# Altium footprint library Pcb-hionyPcbLib.PcbLib: 580 footprints (part 25 of 37)
Each footprint in its own frame and in the unit in brackets; x right, y up, seen from the top. Pads: shape width x height; smd on the part's side, far side on the other; paste and mask are expansions set on the pad; w line width, h text height; cw(c..) or ccw(c..) is an arc to the next point about the centre after c.
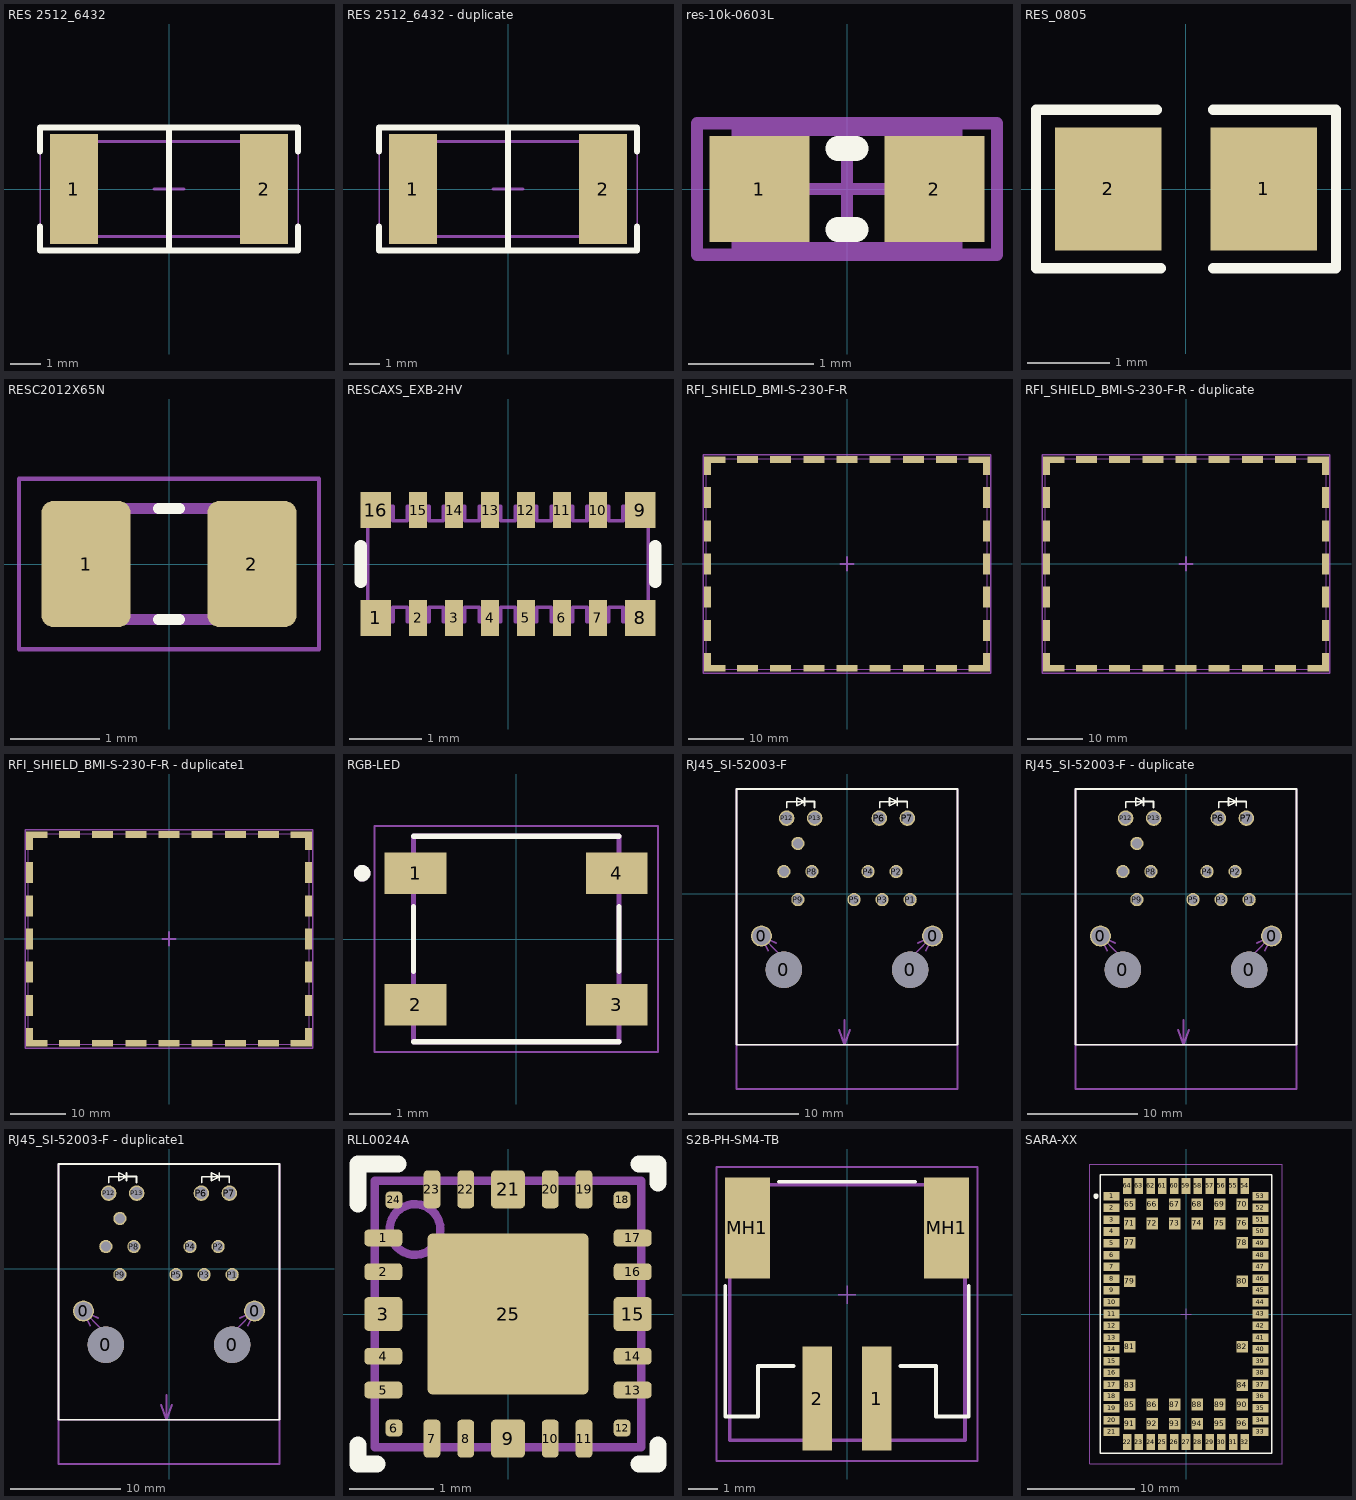
[diagram p24: the footprints below, top view; thin cyan lines are the x and y axes]

## RES 2512_6432 [mm]
pads (2):
  rect 1.6x3.65 smd: 1(-3.175,0) 2(3.175,0)
Top Overlay:
  lines w0.2: -4.3,-1.25 -4.3,-2.05 4.3,-2.05 4.3,-1.25 ; -4.3,1.25 -4.3,2.05 4.3,2.05 4.3,1.25 ; 0,-2.05 0,2.05
Mechanical 13:
  lines w0.1: -3.149,-1.575 3.15,-1.575 3.15,1.225 3.15,1.575 -3.149,1.575 -3.149,-1.575
Mechanical 15:
  lines w0.05: -4.3,-2.1 4.3,-2.1 4.3,2.1 -4.3,2.1 -4.3,-2.1
  lines w0.1: -0.5,0 0.5,0 ; 0,-0.5 0,0.5
3D body "RES - 2512.step": height 0.7, standoff 0, extent -3.15,-1.575 3.15,1.575

## RES 2512_6432 - duplicate [mm]
pads (2):
  rect 1.6x3.65 smd: 1(-3.175,0) 2(3.175,0)
Top Overlay:
  lines w0.2: -4.3,-1.25 -4.3,-2.05 4.3,-2.05 4.3,-1.25 ; -4.3,1.25 -4.3,2.05 4.3,2.05 4.3,1.25 ; 0,-2.05 0,2.05
Mechanical 13:
  lines w0.1: -3.149,-1.575 3.15,-1.575 3.15,1.225 3.15,1.575 -3.149,1.575 -3.149,-1.575
Mechanical 15:
  lines w0.05: -4.3,-2.1 4.3,-2.1 4.3,2.1 -4.3,2.1 -4.3,-2.1
  lines w0.1: -0.5,0 0.5,0 ; 0,-0.5 0,0.5
3D body "RES - 2512.step": height 0.7, standoff 0, extent -3.15,-1.575 3.15,1.575

## res-10k-0603L [mm]
pads (2):
  rect 0.8x0.85 smd: 1(-0.7,0) 2(0.7,0)
Top Overlay:
  lines w0.2: -0.071,-0.325 0.071,-0.325 ; -0.071,0.325 0.071,0.325
Top 3D Body:
  lines w0.1: -1.2,-0.525 1.2,-0.525 1.2,0.525 -1.2,0.525 -1.2,-0.525
  text ".Designator" at -1.05,-0.275 h0.56
Mechanical 13:
  lines w0.1: -0.55,-0.475 -0.55,0.475 ; 0.55,-0.475 0.55,0.475 ; -0.875,-0.475 0.875,-0.475 0.875,0.475 -0.875,0.475 -0.875,-0.475
Mechanical 15:
  lines w0.1: -0.475,0 0.475,0 ; 0,-0.475 0,0.475 ; -1.2,-0.525 -1.2,0.525 1.2,0.525 1.2,-0.525 -1.2,-0.525
3D body: height 1, standoff 0, extent -0.874,-0.474 -0.551,0.474
3D body: height 1, standoff 0, extent -0.549,-0.474 0.549,0.474
3D body: height 1, standoff 0, extent 0.551,-0.474 0.874,0.474

## RES_0805 [mm] "Resister"
height 0.65
pads (2):
  rect 1.3x1.5 smd mask+0.076: 1(0.95,0) 2(-0.95,0)
Top Overlay:
  lines w0.127: -0.356,0.965 -1.829,0.965 -1.829,-0.965 -0.305,-0.965 ; 0.33,-0.965 1.829,-0.965 1.829,0.965 0.33,0.965
3D body "RES0805.stp": height 0.5, standoff 0, extent -1,-0.63 1,0.62

## RESC2012X65N [mm]
pads (2):
  rrect25% 1x1.42 smd: 1(-0.935,0) 2(0.935,0)
Top Overlay:
  lines w0.127: -0.115,-0.625 0.115,-0.625 ; -0.115,0.625 0.115,0.625
Mechanical 13:
  lines w0.127: -1,-0.625 -1,0.625 1,0.625 1,-0.625 -1,-0.625
Mechanical 15:
  lines w0.05: -1.69,-0.96 -1.69,0.96 1.69,0.96 1.69,-0.96 -1.69,-0.96
3D body "step_temp.STEP": height 0.65, standoff 0, extent -1,-0.625 1,0.625

## RESCAXS_EXB-2HV [mm]
pads (16):
  rect 0.425x0.5 smd mask+0.07: 1(-1.837,-0.75) 8(1.837,-0.75) 9(1.837,0.75) 16(-1.837,0.75)
  rect 0.25x0.5 smd mask+0.07: 2(-1.25,-0.75) 3(-0.75,-0.75) 4(-0.25,-0.75) 5(0.25,-0.75) 6(0.75,-0.75) 7(1.25,-0.75) 10(1.25,0.75) 11(0.75,0.75) 12(0.25,0.75) 13(-0.25,0.75) 14(-0.75,0.75) 15(-1.25,0.75)
Top Overlay:
  lines w0.17: -2.05,-0.25 -2.05,0.25 ; 2.05,-0.25 2.05,0.25
Top 3D Body:
  lines w0.05: -1.95,-0.8 -1.95,0.8 -1.6,0.8 -1.6,0.6 -1.4,0.6 -1.4,0.8 -1.1,0.8 -1.1,0.6 -0.9,0.6 -0.9,0.8 -0.6,0.8 -0.6,0.6 -0.4,0.6 -0.4,0.8 -0.1,0.8 -0.1,0.6 0.1,0.6 0.1,0.8 0.4,0.8 0.4,0.6 0.6,0.6 0.6,0.8 0.9,0.8 0.9,0.6 1.1,0.6 1.1,0.8 1.4,0.8 1.4,0.6 1.6,0.6 1.6,0.8 1.95,0.8 1.95,-0.8 1.6,-0.8 1.6,-0.6 1.4,-0.6 1.4,-0.8 1.1,-0.8 1.1,-0.6 0.9,-0.6 0.9,-0.8 0.6,-0.8 0.6,-0.6 0.4,-0.6 0.4,-0.8 0.1,-0.8 0.1,-0.6 -0.1,-0.6 -0.1,-0.8 -0.4,-0.8 -0.4,-0.6 -0.6,-0.6 -0.6,-0.8 -0.9,-0.8 -0.9,-0.6 -1.1,-0.6 -1.1,-0.8 -1.4,-0.8 -1.4,-0.6 -1.6,-0.6 -1.6,-0.8 -1.95,-0.8
  text ".Designator" at -0.9,-0.25 h0.5
3D body: height 0.55, standoff 0, extent -1.949,-0.799 1.949,0.799
3D body: height 0.55, standoff 0.52, extent -1.949,-0.449 1.949,0.449

## RFI_SHIELD_BMI-S-230-F-R [mm]
pads (32):
  rect 1.2x3.35 smd mask+0.05: 1(-25.2,-17.787) 1(-25.2,17.762) 1(25.2,-17.787) 1(25.2,17.762)
  rect 1.2x3.8 smd mask+0.05: 1(-25.2,-12.013) 1(-25.2,-6.013) 1(-25.2,-0.012) 1(-25.2,5.988) 1(-25.2,11.988) 1(25.2,-12.013) 1(25.2,-6.013) 1(25.2,-0.012) 1(25.2,5.988) 1(25.2,11.988)
  rect 3.85x1.2 smd mask+0.05: 1(-23.875,-18.862) 1(-23.875,18.838) 1(23.875,-18.862) 1(23.875,18.838)
  rect 3.8x1.2 smd mask+0.05: 1(-18,-18.837) 1(-18,18.863) 1(-12,-18.837) 1(-12,18.863) 1(-6,-18.837) 1(-6,18.863) 1(0,-18.837) 1(0,18.863) 1(6,-18.837) 1(6,18.863) 1(12,-18.837) 1(12,18.863) 1(18,-18.837) 1(18,18.863)
Mechanical 13:
  lines w0.15: -25.425,-19.062 -25.425,19.037 25.375,19.037 25.375,-19.062 -25.425,-19.062 ; -17.65,-19.062 -17.65,-19.063
Mechanical 15:
  lines w0.3: -1.25,0 1.25,0 ; 0,-1.25 0,1.25 ; -26,-19.75 -26,19.75 26,19.75 26,-19.75 -26,-19.75
  text "RF shield (frame + cover)" at -22.35,-19.2 h0.55
  text ".Designator" at -25.55,-19.2 h0.55
3D body "Masach Technologies-MS511-20.STEP": height 6.6, standoff -0.8, extent -26.15,-19.8 26.15,19.8

## RFI_SHIELD_BMI-S-230-F-R - duplicate [mm]
pads (32):
  rect 1.2x3.35 smd mask+0.05: 1(-25.2,-17.787) 1(-25.2,17.762) 1(25.2,-17.787) 1(25.2,17.762)
  rect 1.2x3.8 smd mask+0.05: 1(-25.2,-12.013) 1(-25.2,-6.013) 1(-25.2,-0.012) 1(-25.2,5.988) 1(-25.2,11.988) 1(25.2,-12.013) 1(25.2,-6.013) 1(25.2,-0.012) 1(25.2,5.988) 1(25.2,11.988)
  rect 3.85x1.2 smd mask+0.05: 1(-23.875,-18.862) 1(-23.875,18.838) 1(23.875,-18.862) 1(23.875,18.838)
  rect 3.8x1.2 smd mask+0.05: 1(-18,-18.837) 1(-18,18.863) 1(-12,-18.837) 1(-12,18.863) 1(-6,-18.837) 1(-6,18.863) 1(0,-18.837) 1(0,18.863) 1(6,-18.837) 1(6,18.863) 1(12,-18.837) 1(12,18.863) 1(18,-18.837) 1(18,18.863)
Mechanical 13:
  lines w0.15: -25.425,-19.062 -25.425,19.037 25.375,19.037 25.375,-19.062 -25.425,-19.062 ; -17.65,-19.062 -17.65,-19.063
Mechanical 15:
  lines w0.3: -1.25,0 1.25,0 ; 0,-1.25 0,1.25 ; -26,-19.75 -26,19.75 26,19.75 26,-19.75 -26,-19.75
  text "RF shield (frame + cover)" at -22.05,-19.225 h0.55
  text ".Designator" at -25.6,-19.325 h0.55
3D body "Masach Technologies-MS511-20.STEP": height 6.6, standoff -0.8, extent -26.15,-19.8 26.15,19.8

## RFI_SHIELD_BMI-S-230-F-R - duplicate1 [mm]
pads (32):
  rect 1.2x3.35 smd mask+0.05: 1(-25.2,-17.787) 1(-25.2,17.762) 1(25.2,-17.787) 1(25.2,17.762)
  rect 1.2x3.8 smd mask+0.05: 1(-25.2,-12.013) 1(-25.2,-6.013) 1(-25.2,-0.012) 1(-25.2,5.988) 1(-25.2,11.988) 1(25.2,-12.013) 1(25.2,-6.013) 1(25.2,-0.012) 1(25.2,5.988) 1(25.2,11.988)
  rect 3.85x1.2 smd mask+0.05: 1(-23.875,-18.862) 1(-23.875,18.838) 1(23.875,-18.862) 1(23.875,18.838)
  rect 3.8x1.2 smd mask+0.05: 1(-18,-18.837) 1(-18,18.863) 1(-12,-18.837) 1(-12,18.863) 1(-6,-18.837) 1(-6,18.863) 1(0,-18.837) 1(0,18.863) 1(6,-18.837) 1(6,18.863) 1(12,-18.837) 1(12,18.863) 1(18,-18.837) 1(18,18.863)
Mechanical 13:
  lines w0.15: -25.425,-19.062 -25.425,19.037 25.375,19.037 25.375,-19.062 -25.425,-19.062 ; -17.65,-19.062 -17.65,-19.063
Mechanical 15:
  lines w0.3: -1.25,0 1.25,0 ; 0,-1.25 0,1.25 ; -26,-19.75 -26,19.75 26,19.75 26,-19.75 -26,-19.75
  text "RF shield (frame + cover)" at -22.05,-19.225 h0.55
  text ".Designator" at -25.6,-19.325 h0.55
3D body "Masach Technologies-MS511-20.STEP": height 6.6, standoff -0.8, extent -26.15,-19.8 26.15,19.8

## RGB-LED [mm]
pads (4):
  rect 1.5x1 smd: 1(-2.45,1.6) 2(-2.45,-1.6) 3(2.45,-1.6) 4(2.45,1.6)
Top Overlay:
  circle w0.2: c-3.75,1.6 r0.1
  lines w0.127: -2.5,-2.5 2.5,-2.5 ; -2.5,-0.787 -2.5,0.787 ; -2.5,2.5 2.5,2.5 ; 2.5,-0.787 2.5,0.787
Mechanical 13:
  circle w0.2: c-3.75,1.6 r0.1
  lines w0.127: -2.5,-2.5 2.5,-2.5 2.5,2.5 -2.5,2.5 -2.5,-2.5
Mechanical 15:
  lines w0.05: -3.45,-2.75 3.45,-2.75 3.45,2.75 -3.45,2.75 -3.45,-2.75
3D body "1655--3DModel-STEP-56544.STEP": height 1.5, standoff -0.1, extent -2.7,-2.5 2.7,2.5

## RJ45_SI-52003-F [mm]
pads (17):
  round 1.9 hole 1.6 mask+0.05: 0(-7.745,-3.81) 0(7.745,-3.81)
  round 3.3 hole 3.3 unplated mask+0.05: 0(-5.715,-6.86) 0(5.715,-6.86)
  round 1.2 hole 0.9 mask+0.05: P1(5.715,-0.51) P2(4.445,2.03) P3(3.175,-0.51) P4(1.905,2.03) P5(0.635,-0.51) P8(-3.175,2.03) P9(-4.445,-0.51) P10(-5.715,2.03) P11(-4.445,4.57)
  round 1.4 hole 1.1 mask+0.05: P6(2.925,6.86) P7(5.465,6.86) P12(-5.465,6.86) P13(-2.925,6.86)
Top Overlay:
  lines w0.15: -5.44,7.815 -5.44,8.34 -3.84,8.34 ; -3.84,7.99 -3.84,8.69 ; -3.84,8.365 -2.94,8.365 -2.94,7.815 ; 2.95,7.815 2.95,8.34 4.55,8.34 ; 4.55,7.99 4.55,8.69 ; 4.55,8.365 5.45,8.365 5.45,7.815 ; -3.84,8.34 -4.54,7.99 -4.54,8.69 -3.84,8.34 ; 4.55,8.34 3.85,8.69 3.85,7.99 4.55,8.34 ; -10,-13.66 10,-13.66 10,9.5 -10,9.5 -10,-13.66
Mechanical 15:
  lines w0.15: -10,-13.66 10,-13.66 ; -7.119,-5.143 -7.745,-3.81 ; -6.412,-4.436 -7.745,-3.81 ; -6.147,-5.408 -7.745,-3.81 ; -0.725,-12.275 -0.225,-13.66 ; -0.225,-11.4 -0.225,-13.66 ; 0.275,-12.275 -0.225,-13.66 ; 6.147,-5.408 7.745,-3.81 ; 6.412,-4.436 7.745,-3.81 ; 7.119,-5.143 7.745,-3.81 ; -10,-17.65 -10,9.5 10,9.5 10,-17.65 -10,-17.65
  text "6 / (A)" at 3.55,7.555 h0.55
  text "12 / (A)" at -4.675,7.555 h0.55
  text "13 / (C)" at -2.225,7.68 h0.55
  text "7 / (C)" at 6.1,7.505 h0.55
  text "board edge" at 2.625,-10.47 h0.55
  text "1" at 5.825,-0.27 h0.55
  text "2" at 4.675,2.28 h0.55
  text "3" at 3.35,-0.245 h0.55
  text "4" at 2.125,2.317 h0.55
  text "5" at 0.8,-0.245 h0.55
  text "8" at -2.975,2.33 h0.55
  text "9" at -4.275,-0.195 h0.55
  text "10" at -5.225,2.255 h0.55
  text "11" at -4.075,4.73 h0.55
  text ".Designator" at 1.05,-2.295 h0.55
  text "Assembly Note: solder plated holes" at 8.8,-6.32 h0.55
3D body: height 13.6, standoff 0, extent -8,3.025 8,7.7
3D body "ACC-M-RJE60-188-5X01-REVT1_v2.STEP": height 14.73, standoff -0.04, extent -9.105,-17.62 9.105,3.87
3D body: height 0, standoff -2.5, extent -5.961,6.361 -4.965,7.359
3D body: height 0, standoff -2.5, extent -3.421,6.361 -2.425,7.359
3D body: height 0, standoff -2.5, extent 2.429,6.361 3.425,7.359
3D body: height 0, standoff -2.5, extent 4.969,6.361 5.965,7.359
3D body: height 0, standoff -2.5, extent -4.842,4.171 -4.045,4.969
3D body: height 0, standoff -2.5, extent 1.508,1.631 2.305,2.429
3D body: height 0, standoff -2.5, extent 4.048,1.631 4.845,2.429
3D body: height 0, standoff -2.5, extent -3.572,1.631 -2.775,2.429
3D body: height 0, standoff -2.5, extent -6.112,1.631 -5.315,2.429
3D body: height 0, standoff -2.5, extent -4.842,-0.909 -4.045,-0.111
3D body: height 0, standoff -2.5, extent 0.238,-0.909 1.035,-0.111
3D body: height 0, standoff -2.5, extent 2.778,-0.909 3.575,-0.111
3D body: height 0, standoff -2.5, extent 5.318,-0.909 6.115,-0.111
3D body: height 0, standoff -2.5, extent -7.315,-8.457 -4.115,-5.263
3D body: height 0, standoff -2.5, extent 4.115,-8.457 7.315,-5.263
3D body: height 0, standoff -2.5, extent -8.539,-4.608 -6.945,-3.012
3D body: height 0, standoff -2.5, extent 6.951,-4.608 8.545,-3.012

## RJ45_SI-52003-F - duplicate [mm]
pads (17):
  round 1.9 hole 1.6 mask+0.05: 0(-7.745,-3.81) 0(7.745,-3.81)
  round 3.3 hole 3.3 unplated mask+0.05: 0(-5.715,-6.86) 0(5.715,-6.86)
  round 1.2 hole 0.9 mask+0.05: P1(5.715,-0.51) P2(4.445,2.03) P3(3.175,-0.51) P4(1.905,2.03) P5(0.635,-0.51) P8(-3.175,2.03) P9(-4.445,-0.51) P10(-5.715,2.03) P11(-4.445,4.57)
  round 1.4 hole 1.1 mask+0.05: P6(2.925,6.86) P7(5.465,6.86) P12(-5.465,6.86) P13(-2.925,6.86)
Top Overlay:
  lines w0.15: -5.44,7.815 -5.44,8.34 -3.84,8.34 ; -3.84,7.99 -3.84,8.69 ; -3.84,8.365 -2.94,8.365 -2.94,7.815 ; 2.95,7.815 2.95,8.34 4.55,8.34 ; 4.55,7.99 4.55,8.69 ; 4.55,8.365 5.45,8.365 5.45,7.815 ; -3.84,8.34 -4.54,7.99 -4.54,8.69 -3.84,8.34 ; 4.55,8.34 3.85,8.69 3.85,7.99 4.55,8.34 ; -10,-13.66 10,-13.66 10,9.5 -10,9.5 -10,-13.66
Mechanical 15:
  lines w0.15: -10,-13.66 10,-13.66 ; -7.119,-5.143 -7.745,-3.81 ; -6.412,-4.436 -7.745,-3.81 ; -6.147,-5.408 -7.745,-3.81 ; -0.725,-12.275 -0.225,-13.66 ; -0.225,-11.4 -0.225,-13.66 ; 0.275,-12.275 -0.225,-13.66 ; 6.147,-5.408 7.745,-3.81 ; 6.412,-4.436 7.745,-3.81 ; 7.119,-5.143 7.745,-3.81 ; -10,-17.65 -10,9.5 10,9.5 10,-17.65 -10,-17.65
  text "6 / (A)" at 3.55,7.555 h0.55
  text "7 / (C)" at 6.1,7.505 h0.55
  text "13 / (C)" at -2.225,7.68 h0.55
  text "12 / (A)" at -4.675,7.555 h0.55
  text "board edge" at 2.625,-10.47 h0.55
  text "1" at 5.825,-0.27 h0.55
  text "2" at 4.675,2.28 h0.55
  text "3" at 3.35,-0.245 h0.55
  text "4" at 2.125,2.317 h0.55
  text "5" at 0.8,-0.245 h0.55
  text "8" at -2.975,2.33 h0.55
  text "9" at -4.275,-0.195 h0.55
  text "10" at -5.225,2.255 h0.55
  text "11" at -4.075,4.73 h0.55
  text ".Designator" at 1.05,-2.295 h0.55
  text "Assembly Note: solder plated holes" at 8.8,-6.32 h0.55
3D body: height 13.6, standoff 0, extent -8,3.025 8,7.7
3D body "ACC-M-RJE60-188-5X01-REVT1_v2.STEP": height 14.73, standoff -0.04, extent -9.105,-17.62 9.105,3.87
3D body: height 0, standoff -2.5, extent -5.961,6.361 -4.965,7.359
3D body: height 0, standoff -2.5, extent -3.421,6.361 -2.425,7.359
3D body: height 0, standoff -2.5, extent 2.429,6.361 3.425,7.359
3D body: height 0, standoff -2.5, extent 4.969,6.361 5.965,7.359
3D body: height 0, standoff -2.5, extent -4.842,4.171 -4.045,4.969
3D body: height 0, standoff -2.5, extent 1.508,1.631 2.305,2.429
3D body: height 0, standoff -2.5, extent 4.048,1.631 4.845,2.429
3D body: height 0, standoff -2.5, extent -3.572,1.631 -2.775,2.429
3D body: height 0, standoff -2.5, extent -6.112,1.631 -5.315,2.429
3D body: height 0, standoff -2.5, extent -4.842,-0.909 -4.045,-0.111
3D body: height 0, standoff -2.5, extent 0.238,-0.909 1.035,-0.111
3D body: height 0, standoff -2.5, extent 2.778,-0.909 3.575,-0.111
3D body: height 0, standoff -2.5, extent 5.318,-0.909 6.115,-0.111
3D body: height 0, standoff -2.5, extent -7.315,-8.457 -4.115,-5.263
3D body: height 0, standoff -2.5, extent 4.115,-8.457 7.315,-5.263
3D body: height 0, standoff -2.5, extent -8.539,-4.608 -6.945,-3.012
3D body: height 0, standoff -2.5, extent 6.951,-4.608 8.545,-3.012

## RJ45_SI-52003-F - duplicate1 [mm]
pads (17):
  round 1.9 hole 1.6 mask+0.05: 0(-7.745,-3.81) 0(7.745,-3.81)
  round 3.3 hole 3.3 unplated mask+0.05: 0(-5.715,-6.86) 0(5.715,-6.86)
  round 1.2 hole 0.9 mask+0.05: P1(5.715,-0.51) P2(4.445,2.03) P3(3.175,-0.51) P4(1.905,2.03) P5(0.635,-0.51) P8(-3.175,2.03) P9(-4.445,-0.51) P10(-5.715,2.03) P11(-4.445,4.57)
  round 1.4 hole 1.1 mask+0.05: P6(2.925,6.86) P7(5.465,6.86) P12(-5.465,6.86) P13(-2.925,6.86)
Top Overlay:
  lines w0.15: -5.44,7.815 -5.44,8.34 -3.84,8.34 ; -3.84,7.99 -3.84,8.69 ; -3.84,8.365 -2.94,8.365 -2.94,7.815 ; 2.95,7.815 2.95,8.34 4.55,8.34 ; 4.55,7.99 4.55,8.69 ; 4.55,8.365 5.45,8.365 5.45,7.815 ; -3.84,8.34 -4.54,7.99 -4.54,8.69 -3.84,8.34 ; 4.55,8.34 3.85,8.69 3.85,7.99 4.55,8.34 ; -10,-13.66 10,-13.66 10,9.5 -10,9.5 -10,-13.66
Mechanical 15:
  lines w0.15: -10,-13.66 10,-13.66 ; -7.119,-5.143 -7.745,-3.81 ; -6.412,-4.436 -7.745,-3.81 ; -6.147,-5.408 -7.745,-3.81 ; -0.725,-12.275 -0.225,-13.66 ; -0.225,-11.4 -0.225,-13.66 ; 0.275,-12.275 -0.225,-13.66 ; 6.147,-5.408 7.745,-3.81 ; 6.412,-4.436 7.745,-3.81 ; 7.119,-5.143 7.745,-3.81 ; -10,-17.65 -10,9.5 10,9.5 10,-17.65 -10,-17.65
  text "6 / (A)" at 3.55,7.555 h0.55
  text "7 / (C)" at 6.1,7.505 h0.55
  text "13 / (C)" at -2.225,7.68 h0.55
  text "12 / (A)" at -4.675,7.555 h0.55
  text "board edge" at 2.625,-10.47 h0.55
  text "1" at 5.825,-0.27 h0.55
  text "2" at 4.675,2.28 h0.55
  text "3" at 3.35,-0.245 h0.55
  text "4" at 2.125,2.317 h0.55
  text "5" at 0.8,-0.245 h0.55
  text "8" at -2.975,2.33 h0.55
  text "9" at -4.275,-0.195 h0.55
  text "10" at -5.225,2.255 h0.55
  text "11" at -4.075,4.73 h0.55
  text ".Designator" at 1.05,-2.295 h0.55
  text "Assembly Note: solder plated holes" at 8.8,-6.32 h0.55
3D body: height 13.6, standoff 0, extent -8,3.025 8,7.7
3D body "ACC-M-RJE60-188-5X01-REVT1_v2.STEP": height 14.73, standoff -0.04, extent -9.105,-17.62 9.105,3.87
3D body: height 0, standoff -2.5, extent -5.961,6.361 -4.965,7.359
3D body: height 0, standoff -2.5, extent -3.421,6.361 -2.425,7.359
3D body: height 0, standoff -2.5, extent 2.429,6.361 3.425,7.359
3D body: height 0, standoff -2.5, extent 4.969,6.361 5.965,7.359
3D body: height 0, standoff -2.5, extent -4.842,4.171 -4.045,4.969
3D body: height 0, standoff -2.5, extent 1.508,1.631 2.305,2.429
3D body: height 0, standoff -2.5, extent 4.048,1.631 4.845,2.429
3D body: height 0, standoff -2.5, extent -3.572,1.631 -2.775,2.429
3D body: height 0, standoff -2.5, extent -6.112,1.631 -5.315,2.429
3D body: height 0, standoff -2.5, extent -4.842,-0.909 -4.045,-0.111
3D body: height 0, standoff -2.5, extent 0.238,-0.909 1.035,-0.111
3D body: height 0, standoff -2.5, extent 2.778,-0.909 3.575,-0.111
3D body: height 0, standoff -2.5, extent 5.318,-0.909 6.115,-0.111
3D body: height 0, standoff -2.5, extent -7.315,-8.457 -4.115,-5.263
3D body: height 0, standoff -2.5, extent 4.115,-8.457 7.315,-5.263
3D body: height 0, standoff -2.5, extent -8.539,-4.608 -6.945,-3.012
3D body: height 0, standoff -2.5, extent 6.951,-4.608 8.545,-3.012

## RLL0024A [mm]
pads (26):
  rrect50% 0.45x0.2 smd: 1(-1.475,0.9) 2(-1.475,0.5) 4(-1.475,-0.5) 5(-1.475,-0.9) 13(1.475,-0.9) 14(1.475,-0.5) 16(1.475,0.5) 17(1.475,0.9)
  rrect25% 0.45x0.4 smd: 3(-1.475,0) 15(1.475,0)
  rrect50% 0.2x0.2 smd: 6(-1.35,-1.35) 12(1.35,-1.35) 18(1.35,1.35) 24(-1.35,1.35)
  rrect50% 0.2x0.45 smd: 7(-0.9,-1.475) 8(-0.5,-1.475) 10(0.5,-1.475) 11(0.9,-1.475) 19(0.9,1.475) 20(0.5,1.475) 22(-0.5,1.475) 23(-0.9,1.475)
  rrect25% 0.4x0.45 smd: 9(0,-1.475) 21(0,1.475)
  rrect5% 1.9x1.9 smd paste-1.9: 25(0,0)
  rrect50% 1.71x1.71 on Top Paste: ""(0,0)
Top Overlay:
  lines w0.2: -1.775,-1.55 -1.775,-1.775 -1.55,-1.775 ; -1.775,1.3 -1.775,1.775 -1.3,1.775 ; 1.55,-1.775 1.775,-1.775 1.775,-1.55 ; 1.55,1.775 1.775,1.775 1.775,1.55
Top 3D Body:
  circle w0.1: c-1.1,1 r0.3
  lines w0.1: -1.575,-1.575 1.575,-1.575 1.575,1.575 -1.575,1.575 -1.575,-1.575
  text ".Designator" at 0.7,-3.9 h1.52
3D body: height 1.01, standoff 1, extent -1.399,0.701 -0.801,1.299
3D body: height 1, standoff 0.08, extent -1.575,-1.575 1.575,1.575

## S2B-PH-SM4-TB [mm]
pads (4):
  rect 1x3.5 smd: 1(1,-3.5) 2(-1,-3.5)
  rect 1.5x3.4 smd: MH1(-3.35,2.25) MH1(3.35,2.25)
Top Overlay:
  lines w0.127: -4.1,0.3 -4.1,-4.1 -3,-4.1 -3,-2.4 -1.8,-2.4 ; -2.3,3.8 2.3,3.8 ; 1.8,-2.4 3,-2.4 3,-4.1 4.1,-4.1 4.1,0.3
Mechanical 11:
  text ".Designator" at -0.575,0.092 h0.5
Mechanical 13:
  lines w0.127: -3.95,-4.9 -3.95,3.7 3.975,3.7 3.975,-4.9 -3.95,-4.9
Mechanical 15:
  lines w0.05: -0.3,0 0.3,0 ; 0,-0.3 0,0.3
  lines w0.064: -4.4,-5.6 4.4,-5.6 4.4,4.3 -4.4,4.3 -4.4,-5.6
3D body "S2B-PH-SM4-TB.STEP": height 5.61, standoff 0.01, extent -3.925,-4.9 3.975,3.7

## SARA-XX [mm]
pads (96):
  rect 1.5x0.8 smd paste-1: 1(-6.95,11) 2(-6.95,9.9) 3(-6.95,8.8) 4(-6.95,7.7) 5(-6.95,6.6) 6(-6.95,5.5) 7(-6.95,4.4) 8(-6.95,3.3) 9(-6.95,2.2) 10(-6.95,1.1) 11(-6.95,0) 12(-6.95,-1.1) 13(-6.95,-2.2) 14(-6.95,-3.3) 15(-6.95,-4.4) 16(-6.95,-5.5) 17(-6.95,-6.6) 18(-6.95,-7.7) 19(-6.95,-8.8) 20(-6.95,-9.9) 21(-6.95,-11) 33(6.95,-11) 34(6.95,-9.9) 35(6.95,-8.8) 36(6.95,-7.7) 37(6.95,-6.6) 38(6.95,-5.5) 39(6.95,-4.4) 40(6.95,-3.3) 41(6.95,-2.2) 42(6.95,-1.1) 43(6.95,0) 44(6.95,1.1) 45(6.95,2.2) 46(6.95,3.3) 47(6.95,4.4) 48(6.95,5.5) 49(6.95,6.6) 50(6.95,7.7) 51(6.95,8.8) 52(6.95,9.9) 53(6.95,11)
  rect 0.8x1.5 smd paste-1: 22(-5.5,-11.95) 23(-4.4,-11.95) 24(-3.3,-11.95) 25(-2.2,-11.95) 26(-1.1,-11.95) 27(0,-11.95) 28(1.1,-11.95) 29(2.2,-11.95) 30(3.3,-11.95) 31(4.4,-11.95) 32(5.5,-11.95) 54(5.5,11.95) 55(4.4,11.95) 56(3.3,11.95) 57(2.2,11.95) 58(1.1,11.95) 59(0,11.95) 60(-1.1,11.95) 61(-2.2,11.95) 62(-3.3,11.95) 63(-4.4,11.95) 64(-5.5,11.95)
  rect 1.1x1.1 smd paste-0.025: 65(-5.25,10.25) 66(-3.15,10.25) 67(-1.05,10.25) 68(1.05,10.25) 69(3.15,10.25) 70(5.25,10.25) 71(-5.25,8.45) 72(-3.15,8.45) 73(-1.05,8.45) 74(1.05,8.45) 75(3.15,8.45) 76(5.25,8.45) 77(-5.25,6.65) 78(5.25,6.65) 79(-5.25,3.05) 80(5.25,3.05) 81(-5.25,-3.05) 82(5.25,-3.05) 83(-5.25,-6.65) 84(5.25,-6.65) 85(-5.25,-8.45) 86(-3.15,-8.45) 87(-1.05,-8.45) 88(1.05,-8.45) 89(3.15,-8.45) 90(5.25,-8.45) 91(-5.25,-10.25) 92(-3.15,-10.25) 93(-1.05,-10.25) 94(1.05,-10.25) 95(3.15,-10.25) 96(5.25,-10.25)
Top Overlay:
  circle w0.4: c-8.4,11 r0.05
  lines w0.15: -8,-13 -8,13 8,13 8,-13 -8,-13
Top Paste:
  region: -5.125,11.226 -5.125,12.776 -5.875,12.776 -5.875,11.226
  region: -4.024,11.225 -4.024,12.775 -4.774,12.775 -4.774,11.225
  region: -2.924,11.225 -2.924,12.775 -3.674,12.775 -3.674,11.225
  region: -1.824,11.225 -1.824,12.775 -2.574,12.775 -2.574,11.225
  region: -0.724,11.225 -0.724,12.775 -1.474,12.775 -1.474,11.225
  region: 0.375,11.226 0.375,12.776 -0.375,12.776 -0.375,11.226
  region: 1.476,11.225 1.476,12.775 0.726,12.775 0.726,11.225
  region: 5.876,11.225 5.876,12.775 5.126,12.775 5.126,11.225
  region: 2.575,11.226 2.575,12.776 1.825,12.776 1.825,11.226
  region: 3.676,11.225 3.676,12.775 2.926,12.775 2.926,11.225
  region: 4.775,11.226 4.775,12.776 4.025,12.776 4.025,11.226
  rectangle: 6.225,10.624 7.775,11.374
  rectangle: 6.225,9.524 7.775,10.274
  rectangle: 6.226,8.425 7.776,9.175
  rectangle: 6.225,7.324 7.775,8.074
  rectangle: 6.226,6.225 7.776,6.975
  rectangle: 6.225,5.124 7.775,5.874
  rectangle: 6.226,4.025 7.776,4.775
  rectangle: 6.225,2.924 7.775,3.674
  rectangle: 6.226,1.825 7.776,2.575
  rectangle: 6.226,0.725 7.776,1.475
  rectangle: 6.225,-0.376 7.775,0.374
  rectangle: 6.226,-1.475 7.776,-0.725
  rectangle: 6.225,-2.576 7.775,-1.826
  rectangle: 6.226,-3.675 7.776,-2.925
  rectangle: 6.225,-4.776 7.775,-4.026
  rectangle: 6.226,-5.875 7.776,-5.125
  rectangle: 6.226,-6.975 7.776,-6.225
  rectangle: 6.225,-8.076 7.775,-7.326
  rectangle: 6.226,-9.175 7.776,-8.425
  rectangle: 6.225,-10.276 7.775,-9.526
  rectangle: 6.226,-11.375 7.776,-10.625
  region: 5.875,-12.774 5.875,-11.224 5.125,-11.224 5.125,-12.774
  region: 4.776,-12.775 4.776,-11.225 4.026,-11.225 4.026,-12.775
  region: 3.675,-12.774 3.675,-11.224 2.925,-11.224 2.925,-12.774
  region: 2.576,-12.775 2.576,-11.225 1.826,-11.225 1.826,-12.775
  region: 1.475,-12.774 1.475,-11.224 0.725,-11.224 0.725,-12.774
  region: 0.376,-12.775 0.376,-11.225 -0.374,-11.225 -0.374,-12.775
  region: -0.724,-12.775 -0.724,-11.225 -1.474,-11.225 -1.474,-12.775
  region: -1.825,-12.774 -1.825,-11.224 -2.575,-11.224 -2.575,-12.774
  region: -2.924,-12.775 -2.924,-11.225 -3.674,-11.225 -3.674,-12.775
  region: -4.025,-12.774 -4.025,-11.224 -4.775,-11.224 -4.775,-12.774
  region: -5.124,-12.775 -5.124,-11.225 -5.874,-11.225 -5.874,-12.775
  rectangle: -7.774,-11.375 -6.224,-10.625
  rectangle: -7.775,-10.276 -6.225,-9.526
  rectangle: -7.774,-9.175 -6.224,-8.425
  rectangle: -7.775,-8.076 -6.225,-7.326
  rectangle: -7.774,-6.975 -6.224,-6.225
  rectangle: -7.774,-5.875 -6.224,-5.125
  rectangle: -7.775,-4.776 -6.225,-4.026
  rectangle: -7.774,-3.675 -6.224,-2.925
  rectangle: -7.775,-2.576 -6.225,-1.826
  rectangle: -7.774,-1.475 -6.224,-0.725
  rectangle: -7.775,-0.376 -6.225,0.374
  rectangle: -7.774,0.725 -6.224,1.475
  rectangle: -7.774,1.825 -6.224,2.575
  rectangle: -7.775,2.924 -6.225,3.674
  rectangle: -7.774,4.025 -6.224,4.775
  rectangle: -7.775,5.124 -6.225,5.874
  rectangle: -7.774,6.225 -6.224,6.975
  rectangle: -7.775,7.324 -6.225,8.074
  rectangle: -7.774,8.425 -6.224,9.175
  rectangle: -7.775,9.524 -6.225,10.274
  rectangle: -7.775,10.624 -6.225,11.374
Mechanical 15:
  lines w0.05: -9,-14 -9,14 9,14 9,-14 -9,-14
  lines w0.1: -0.5,0 0,0 0.5,0 ; 0,-0.5 0,0.5
  text ".Designator" at 0.1,0.433 h1
3D body "SARA-R5_step.STEP": height 2.21, standoff 0.01, extent -8.008,-12.994 7.992,13.006
3D body "SARA.STEP": height 0.13, standoff -2.87, extent -8,-13.05 8,12.95